# Altium integrated library Weidmueller_OMNIMATE_Signal.IntLib: 2550 symbols (part 9 of 45)
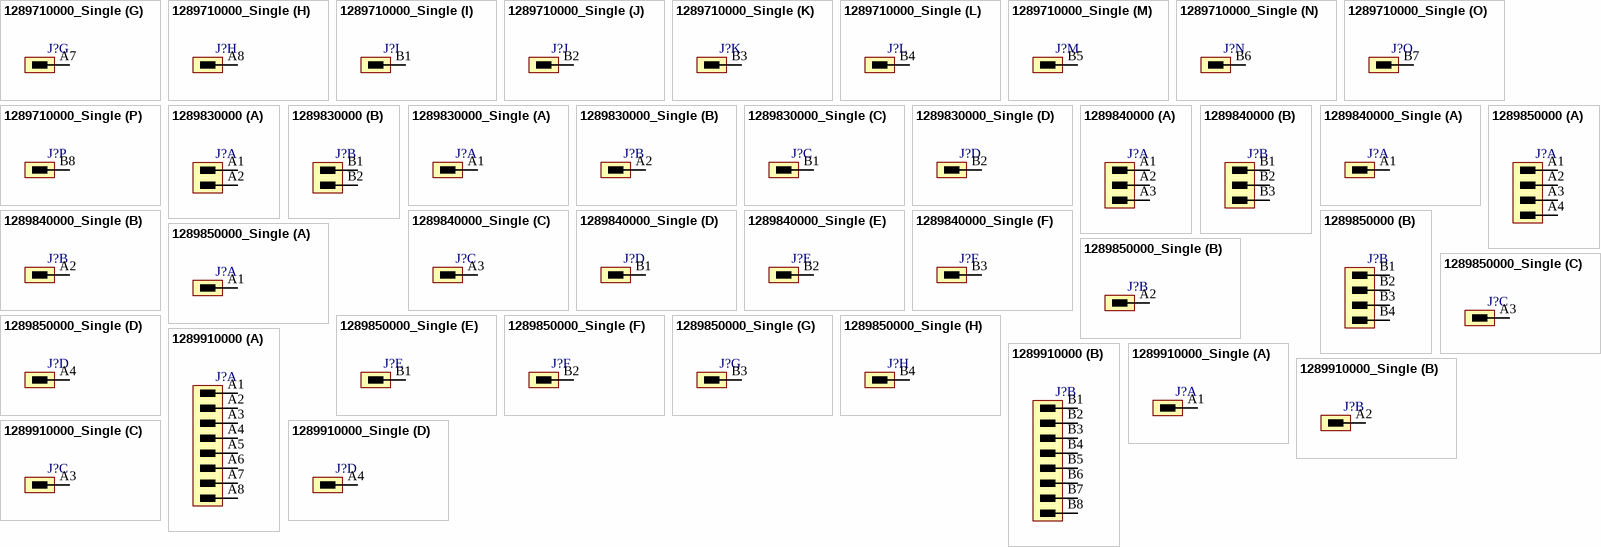
[diagram p219: symbols 1289710000_Single to 1289910000_Single]

## 1289830000_Single
designator J?
OMNIMATE Signal - series B2C/S2C 3.50 - 2-row; PartNumber: 1289830000; Manufacturer: Weidmueller; Short_text_for_material: S2C-SMT 3.50/04/90LF 1.5SN BK BX; Side_termination_characteristic: Solder flange; Mounting_onto_the_PCB: Reflow solder connection; Pitch_mm: 3.5 mm; Pitch_inch: 0.138 inch; No_of_poles: 4; Outgoing_elbow: 90°; Solder_pin_length_mm: 1.5 mm; Contact_material: Cu-Leg; Contact_surface: tinned; Insulating_material: LCP GF; UL_94_flammability_rating: V-0; Rated_voltage_for_surge_voltage_class_pollution_degree_II_2: 200 V; Rated_voltage_use_group_B_UL_1059: 150 V; Rated_current_use_group_B_UL_1059: 10 A; PackageReference: S2C_SMT_3_50_90LF_04; Colour: Black; Packaging: Box; Qty: 132 PCS; Revision: V1; ComponentLink1Description: Manufacturer URL; ComponentLink1URL: http://www.weidmueller.com/; ComponentLink2Description: URL Link1; ComponentLink2URL: http://catalog.weidmueller.com/catalog/Start.do?localeId=en&ObjectID=1289830000
footprint S2C_SMT_3_50_90LF_04 (OMNIMATE Signal - Serie B2C/S2C 3.50 - 2-reihig  S2C-SMT 3.50/04/90LF 1.5)
part A pins: A1
part B pins: A2
part C pins: B1
part D pins: B2

## 1289840000
designator J?
OMNIMATE Signal - series B2C/S2C 3.50 - 2-row; PartNumber: 1289840000; Manufacturer: Weidmueller; Short_text_for_material: S2C-SMT 3.50/06/90LF 1.5SN BK BX; Side_termination_characteristic: Solder flange; Mounting_onto_the_PCB: Reflow solder connection; Pitch_mm: 3.5 mm; Pitch_inch: 0.138 inch; No_of_poles: 6; Outgoing_elbow: 90°; Solder_pin_length_mm: 1.5 mm; Contact_material: Cu-Leg; Contact_surface: tinned; Insulating_material: LCP GF; UL_94_flammability_rating: V-0; Rated_voltage_for_surge_voltage_class_pollution_degree_II_2: 200 V; Rated_voltage_use_group_B_UL_1059: 150 V; Rated_current_use_group_B_UL_1059: 10 A; PackageReference: S2C_SMT_3_50_90LF_06; Colour: Black; Packaging: Box; Qty: 102 PCS; Revision: V1; ComponentLink1Description: Manufacturer URL; ComponentLink1URL: http://www.weidmueller.com/; ComponentLink2Description: URL Link1; ComponentLink2URL: http://catalog.weidmueller.com/catalog/Start.do?localeId=en&ObjectID=1289840000
footprint S2C_SMT_3_50_90LF_06 (OMNIMATE Signal - Serie B2C/S2C 3.50 - 2-reihig  S2C-SMT 3.50/06/90LF 1.5)
part A pins: A1, A2, A3
part B pins: B1, B2, B3

## 1289840000_Single
designator J?
OMNIMATE Signal - series B2C/S2C 3.50 - 2-row; PartNumber: 1289840000; Manufacturer: Weidmueller; Short_text_for_material: S2C-SMT 3.50/06/90LF 1.5SN BK BX; Side_termination_characteristic: Solder flange; Mounting_onto_the_PCB: Reflow solder connection; Pitch_mm: 3.5 mm; Pitch_inch: 0.138 inch; No_of_poles: 6; Outgoing_elbow: 90°; Solder_pin_length_mm: 1.5 mm; Contact_material: Cu-Leg; Contact_surface: tinned; Insulating_material: LCP GF; UL_94_flammability_rating: V-0; Rated_voltage_for_surge_voltage_class_pollution_degree_II_2: 200 V; Rated_voltage_use_group_B_UL_1059: 150 V; Rated_current_use_group_B_UL_1059: 10 A; PackageReference: S2C_SMT_3_50_90LF_06; Colour: Black; Packaging: Box; Qty: 102 PCS; Revision: V1; ComponentLink1Description: Manufacturer URL; ComponentLink1URL: http://www.weidmueller.com/; ComponentLink2Description: URL Link1; ComponentLink2URL: http://catalog.weidmueller.com/catalog/Start.do?localeId=en&ObjectID=1289840000
footprint S2C_SMT_3_50_90LF_06 (OMNIMATE Signal - Serie B2C/S2C 3.50 - 2-reihig  S2C-SMT 3.50/06/90LF 1.5)
part A pins: A1
part B pins: A2
part C pins: A3
part D pins: B1
part E pins: B2
part F pins: B3

## 1289850000
designator J?
OMNIMATE Signal - series B2C/S2C 3.50 - 2-row; PartNumber: 1289850000; Manufacturer: Weidmueller; Short_text_for_material: S2C-SMT 3.50/08/90LF 1.5SN BK BX; Side_termination_characteristic: Solder flange; Mounting_onto_the_PCB: Reflow solder connection; Pitch_mm: 3.5 mm; Pitch_inch: 0.138 inch; No_of_poles: 8; Outgoing_elbow: 90°; Solder_pin_length_mm: 1.5 mm; Contact_material: Cu-Leg; Contact_surface: tinned; Insulating_material: LCP GF; UL_94_flammability_rating: V-0; Rated_voltage_for_surge_voltage_class_pollution_degree_II_2: 200 V; Rated_voltage_use_group_B_UL_1059: 150 V; Rated_current_use_group_B_UL_1059: 10 A; PackageReference: S2C_SMT_3_50_90LF_08; Colour: Black; Packaging: Box; Qty: 84 PCS; Revision: V1; ComponentLink1Description: Manufacturer URL; ComponentLink1URL: http://www.weidmueller.com/; ComponentLink2Description: URL Link1; ComponentLink2URL: http://catalog.weidmueller.com/catalog/Start.do?localeId=en&ObjectID=1289850000
footprint S2C_SMT_3_50_90LF_08 (OMNIMATE Signal - Serie B2C/S2C 3.50 - 2-reihig  S2C-SMT 3.50/08/90LF 1.5)
part A pins: A1, A2, A3, A4
part B pins: B1, B2, B3, B4

## 1289850000_Single
designator J?
OMNIMATE Signal - series B2C/S2C 3.50 - 2-row; PartNumber: 1289850000; Manufacturer: Weidmueller; Short_text_for_material: S2C-SMT 3.50/08/90LF 1.5SN BK BX; Side_termination_characteristic: Solder flange; Mounting_onto_the_PCB: Reflow solder connection; Pitch_mm: 3.5 mm; Pitch_inch: 0.138 inch; No_of_poles: 8; Outgoing_elbow: 90°; Solder_pin_length_mm: 1.5 mm; Contact_material: Cu-Leg; Contact_surface: tinned; Insulating_material: LCP GF; UL_94_flammability_rating: V-0; Rated_voltage_for_surge_voltage_class_pollution_degree_II_2: 200 V; Rated_voltage_use_group_B_UL_1059: 150 V; Rated_current_use_group_B_UL_1059: 10 A; PackageReference: S2C_SMT_3_50_90LF_08; Colour: Black; Packaging: Box; Qty: 84 PCS; Revision: V1; ComponentLink1Description: Manufacturer URL; ComponentLink1URL: http://www.weidmueller.com/; ComponentLink2Description: URL Link1; ComponentLink2URL: http://catalog.weidmueller.com/catalog/Start.do?localeId=en&ObjectID=1289850000
footprint S2C_SMT_3_50_90LF_08 (OMNIMATE Signal - Serie B2C/S2C 3.50 - 2-reihig  S2C-SMT 3.50/08/90LF 1.5)
part A pins: A1
part B pins: A2
part C pins: A3
part D pins: A4
part E pins: B1
part F pins: B2
part G pins: B3
part H pins: B4

## 1289910000
designator J?
OMNIMATE Signal - series B2C/S2C 3.50 - 2-row; PartNumber: 1289910000; Manufacturer: Weidmueller; Short_text_for_material: S2C-SMT 3.50/16/90LF 1.5SN BK BX; Side_termination_characteristic: Solder flange; Mounting_onto_the_PCB: Reflow solder connection; Pitch_mm: 3.5 mm; Pitch_inch: 0.138 inch; No_of_poles: 16; Outgoing_elbow: 90°; Solder_pin_length_mm: 1.5 mm; Contact_material: Cu-Leg; Contact_surface: tinned; Insulating_material: LCP GF; UL_94_flammability_rating: V-0; Rated_voltage_for_surge_voltage_class_pollution_degree_II_2: 200 V; Rated_voltage_use_group_B_UL_1059: 150 V; Rated_current_use_group_B_UL_1059: 10 A; PackageReference: S2C_SMT_3_50_90LF_16; Colour: Black; Packaging: Box; Qty: 48 PCS; Revision: V1; ComponentLink1Description: Manufacturer URL; ComponentLink1URL: http://www.weidmueller.com/; ComponentLink2Description: URL Link1; ComponentLink2URL: http://catalog.weidmueller.com/catalog/Start.do?localeId=en&ObjectID=1289910000
footprint S2C_SMT_3_50_90LF_16 (OMNIMATE Signal - Serie B2C/S2C 3.50 - 2-reihig  S2C-SMT 3.50/16/90LF 1.5)
part A pins: A1, A2, A3, A4, A5, A6, A7, A8
part B pins: B1, B2, B3, B4, B5, B6, B7, B8

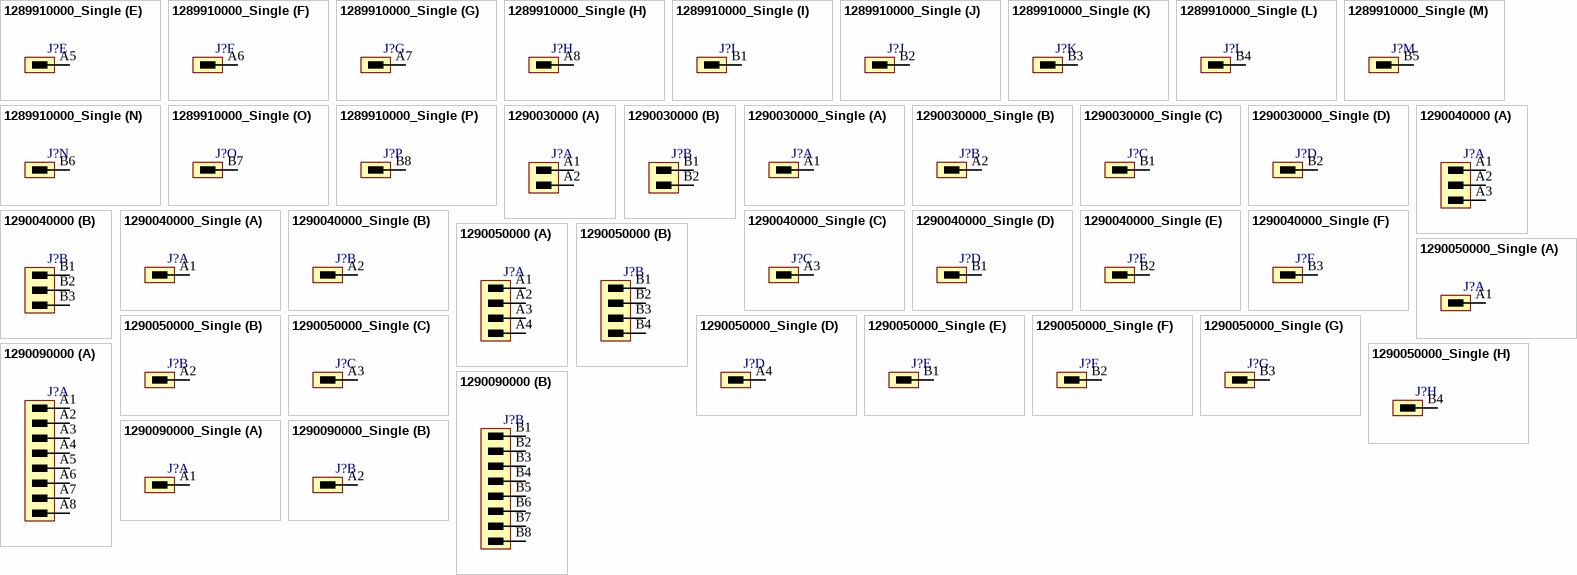
[diagram p50: symbols 1289910000_Single to 1290090000_Single]

## 1289910000_Single
designator J?
OMNIMATE Signal - series B2C/S2C 3.50 - 2-row; PartNumber: 1289910000; Manufacturer: Weidmueller; Short_text_for_material: S2C-SMT 3.50/16/90LF 1.5SN BK BX; Side_termination_characteristic: Solder flange; Mounting_onto_the_PCB: Reflow solder connection; Pitch_mm: 3.5 mm; Pitch_inch: 0.138 inch; No_of_poles: 16; Outgoing_elbow: 90°; Solder_pin_length_mm: 1.5 mm; Contact_material: Cu-Leg; Contact_surface: tinned; Insulating_material: LCP GF; UL_94_flammability_rating: V-0; Rated_voltage_for_surge_voltage_class_pollution_degree_II_2: 200 V; Rated_voltage_use_group_B_UL_1059: 150 V; Rated_current_use_group_B_UL_1059: 10 A; PackageReference: S2C_SMT_3_50_90LF_16; Colour: Black; Packaging: Box; Qty: 48 PCS; Revision: V1; ComponentLink1Description: Manufacturer URL; ComponentLink1URL: http://www.weidmueller.com/; ComponentLink2Description: URL Link1; ComponentLink2URL: http://catalog.weidmueller.com/catalog/Start.do?localeId=en&ObjectID=1289910000
footprint S2C_SMT_3_50_90LF_16 (OMNIMATE Signal - Serie B2C/S2C 3.50 - 2-reihig  S2C-SMT 3.50/16/90LF 1.5)
part A pins: A1
part B pins: A2
part C pins: A3
part D pins: A4
part E pins: A5
part F pins: A6
part G pins: A7
part H pins: A8
part I pins: B1
part J pins: B2
part K pins: B3
part L pins: B4
part M pins: B5
part N pins: B6
part O pins: B7
part P pins: B8

## 1290030000
designator J?
OMNIMATE Signal - series B2C/S2C 3.50 - 2-row; PartNumber: 1290030000; Manufacturer: Weidmueller; Short_text_for_material: S2C-SMT 3.50/04/180G 3.5SN BK BX; Side_termination_characteristic: closed side; Mounting_onto_the_PCB: Reflow solder connection; Pitch_mm: 3.5 mm; Pitch_inch: 0.138 inch; No_of_poles: 4; Outgoing_elbow: 180°; Contact_surface: tinned; Insulating_material: LCP GF; UL_94_flammability_rating: V-0; Rated_voltage_for_surge_voltage_class_pollution_degree_II_2: 200 V; Rated_current_min_no_of_poles_TU_20_deg_C: 13.4 A; Rated_voltage_use_group_B_UL_1059: 150 V; Rated_current_use_group_B_UL_1059: 10 A; PackageReference: S2C_SMT_3_50_180G_04; Colour: Black; Solder_pin_length_mm: 3.5 mm; Packaging: Box; Qty: 222 PCS; Revision: V1; ComponentLink1Description: Manufacturer URL; ComponentLink1URL: http://www.weidmueller.com/; ComponentLink2Description: URL Link1; ComponentLink2URL: http://catalog.weidmueller.com/catalog/Start.do?localeId=en&ObjectID=1290030000
footprint S2C_SMT_3_50_180G_04 (OMNIMATE Signal - Serie B2C/S2C 3.50 - 2-reihig  S2C-SMT 3.50/04/180G 1.5)
part A pins: A1, A2
part B pins: B1, B2

## 1290030000_Single
designator J?
OMNIMATE Signal - series B2C/S2C 3.50 - 2-row; PartNumber: 1290030000; Manufacturer: Weidmueller; Short_text_for_material: S2C-SMT 3.50/04/180G 3.5SN BK BX; Side_termination_characteristic: closed side; Mounting_onto_the_PCB: Reflow solder connection; Pitch_mm: 3.5 mm; Pitch_inch: 0.138 inch; No_of_poles: 4; Outgoing_elbow: 180°; Contact_surface: tinned; Insulating_material: LCP GF; UL_94_flammability_rating: V-0; Rated_voltage_for_surge_voltage_class_pollution_degree_II_2: 200 V; Rated_current_min_no_of_poles_TU_20_deg_C: 13.4 A; Rated_voltage_use_group_B_UL_1059: 150 V; Rated_current_use_group_B_UL_1059: 10 A; PackageReference: S2C_SMT_3_50_180G_04; Colour: Black; Solder_pin_length_mm: 3.5 mm; Packaging: Box; Qty: 222 PCS; Revision: V1; ComponentLink1Description: Manufacturer URL; ComponentLink1URL: http://www.weidmueller.com/; ComponentLink2Description: URL Link1; ComponentLink2URL: http://catalog.weidmueller.com/catalog/Start.do?localeId=en&ObjectID=1290030000
footprint S2C_SMT_3_50_180G_04 (OMNIMATE Signal - Serie B2C/S2C 3.50 - 2-reihig  S2C-SMT 3.50/04/180G 1.5)
part A pins: A1
part B pins: A2
part C pins: B1
part D pins: B2

## 1290040000
designator J?
OMNIMATE Signal - series B2C/S2C 3.50 - 2-row; PartNumber: 1290040000; Manufacturer: Weidmueller; Short_text_for_material: S2C-SMT 3.50/06/180G 3.5SN BK BX; Side_termination_characteristic: closed side; Mounting_onto_the_PCB: Reflow solder connection; Pitch_mm: 3.5 mm; Pitch_inch: 0.138 inch; No_of_poles: 6; Outgoing_elbow: 180°; Contact_surface: tinned; Insulating_material: LCP GF; UL_94_flammability_rating: V-0; Rated_voltage_for_surge_voltage_class_pollution_degree_II_2: 200 V; Rated_current_min_no_of_poles_TU_20_deg_C: 13.4 A; Rated_voltage_use_group_B_UL_1059: 150 V; Rated_current_use_group_B_UL_1059: 10 A; PackageReference: S2C_SMT_3_50_180G_06; Colour: Black; Solder_pin_length_mm: 3.5 mm; Packaging: Box; Qty: 156 PCS; Revision: V1; ComponentLink1Description: Manufacturer URL; ComponentLink1URL: http://www.weidmueller.com/; ComponentLink2Description: URL Link1; ComponentLink2URL: http://catalog.weidmueller.com/catalog/Start.do?localeId=en&ObjectID=1290040000
footprint S2C_SMT_3_50_180G_06 (OMNIMATE Signal - Serie B2C/S2C 3.50 - 2-reihig  S2C-SMT 3.50/06/180G 1.5)
part A pins: A1, A2, A3
part B pins: B1, B2, B3

## 1290040000_Single
designator J?
OMNIMATE Signal - series B2C/S2C 3.50 - 2-row; PartNumber: 1290040000; Manufacturer: Weidmueller; Short_text_for_material: S2C-SMT 3.50/06/180G 3.5SN BK BX; Side_termination_characteristic: closed side; Mounting_onto_the_PCB: Reflow solder connection; Pitch_mm: 3.5 mm; Pitch_inch: 0.138 inch; No_of_poles: 6; Outgoing_elbow: 180°; Contact_surface: tinned; Insulating_material: LCP GF; UL_94_flammability_rating: V-0; Rated_voltage_for_surge_voltage_class_pollution_degree_II_2: 200 V; Rated_current_min_no_of_poles_TU_20_deg_C: 13.4 A; Rated_voltage_use_group_B_UL_1059: 150 V; Rated_current_use_group_B_UL_1059: 10 A; PackageReference: S2C_SMT_3_50_180G_06; Colour: Black; Solder_pin_length_mm: 3.5 mm; Packaging: Box; Qty: 156 PCS; Revision: V1; ComponentLink1Description: Manufacturer URL; ComponentLink1URL: http://www.weidmueller.com/; ComponentLink2Description: URL Link1; ComponentLink2URL: http://catalog.weidmueller.com/catalog/Start.do?localeId=en&ObjectID=1290040000
footprint S2C_SMT_3_50_180G_06 (OMNIMATE Signal - Serie B2C/S2C 3.50 - 2-reihig  S2C-SMT 3.50/06/180G 1.5)
part A pins: A1
part B pins: A2
part C pins: A3
part D pins: B1
part E pins: B2
part F pins: B3

## 1290050000
designator J?
OMNIMATE Signal - series B2C/S2C 3.50 - 2-row; PartNumber: 1290050000; Manufacturer: Weidmueller; Short_text_for_material: S2C-SMT 3.50/08/180G 3.5SN BK BX; Side_termination_characteristic: closed side; Mounting_onto_the_PCB: Reflow solder connection; Pitch_mm: 3.5 mm; Pitch_inch: 0.138 inch; No_of_poles: 8; Outgoing_elbow: 180°; Contact_surface: tinned; Insulating_material: LCP GF; UL_94_flammability_rating: V-0; Rated_voltage_for_surge_voltage_class_pollution_degree_II_2: 200 V; Rated_current_min_no_of_poles_TU_20_deg_C: 13.4 A; Rated_voltage_use_group_B_UL_1059: 150 V; Rated_current_use_group_B_UL_1059: 10 A; PackageReference: S2C_SMT_3_50_180G_08; Colour: Black; Solder_pin_length_mm: 3.5 mm; Packaging: Box; Qty: 120 PCS; Revision: V1; ComponentLink1Description: Manufacturer URL; ComponentLink1URL: http://www.weidmueller.com/; ComponentLink2Description: URL Link1; ComponentLink2URL: http://catalog.weidmueller.com/catalog/Start.do?localeId=en&ObjectID=1290050000
footprint S2C_SMT_3_50_180G_08 (OMNIMATE Signal - Serie B2C/S2C 3.50 - 2-reihig  S2C-SMT 3.50/08/180G 1.5)
part A pins: A1, A2, A3, A4
part B pins: B1, B2, B3, B4

## 1290050000_Single
designator J?
OMNIMATE Signal - series B2C/S2C 3.50 - 2-row; PartNumber: 1290050000; Manufacturer: Weidmueller; Short_text_for_material: S2C-SMT 3.50/08/180G 3.5SN BK BX; Side_termination_characteristic: closed side; Mounting_onto_the_PCB: Reflow solder connection; Pitch_mm: 3.5 mm; Pitch_inch: 0.138 inch; No_of_poles: 8; Outgoing_elbow: 180°; Contact_surface: tinned; Insulating_material: LCP GF; UL_94_flammability_rating: V-0; Rated_voltage_for_surge_voltage_class_pollution_degree_II_2: 200 V; Rated_current_min_no_of_poles_TU_20_deg_C: 13.4 A; Rated_voltage_use_group_B_UL_1059: 150 V; Rated_current_use_group_B_UL_1059: 10 A; PackageReference: S2C_SMT_3_50_180G_08; Colour: Black; Solder_pin_length_mm: 3.5 mm; Packaging: Box; Qty: 120 PCS; Revision: V1; ComponentLink1Description: Manufacturer URL; ComponentLink1URL: http://www.weidmueller.com/; ComponentLink2Description: URL Link1; ComponentLink2URL: http://catalog.weidmueller.com/catalog/Start.do?localeId=en&ObjectID=1290050000
footprint S2C_SMT_3_50_180G_08 (OMNIMATE Signal - Serie B2C/S2C 3.50 - 2-reihig  S2C-SMT 3.50/08/180G 1.5)
part A pins: A1
part B pins: A2
part C pins: A3
part D pins: A4
part E pins: B1
part F pins: B2
part G pins: B3
part H pins: B4

## 1290090000
designator J?
OMNIMATE Signal - series B2C/S2C 3.50 - 2-row; PartNumber: 1290090000; Manufacturer: Weidmueller; Short_text_for_material: S2C-SMT 3.50/16/180G 3.5SN BK BX; Side_termination_characteristic: closed side; Mounting_onto_the_PCB: Reflow solder connection; Pitch_mm: 3.5 mm; Pitch_inch: 0.138 inch; No_of_poles: 16; Outgoing_elbow: 180°; Contact_surface: tinned; Insulating_material: LCP GF; UL_94_flammability_rating: V-0; Rated_voltage_for_surge_voltage_class_pollution_degree_II_2: 200 V; Rated_current_min_no_of_poles_TU_20_deg_C: 13.4 A; Rated_voltage_use_group_B_UL_1059: 150 V; Rated_current_use_group_B_UL_1059: 10 A; PackageReference: S2C_SMT_3_50_180G_16; Colour: Black; Solder_pin_length_mm: 3.5 mm; Packaging: Box; Qty: 60 PCS; Revision: V1; ComponentLink1Description: Manufacturer URL; ComponentLink1URL: http://www.weidmueller.com/; ComponentLink2Description: URL Link1; ComponentLink2URL: http://catalog.weidmueller.com/catalog/Start.do?localeId=en&ObjectID=1290090000
footprint S2C_SMT_3_50_180G_16 (OMNIMATE Signal - Serie B2C/S2C 3.50 - 2-reihig  S2C-SMT 3.50/16/180G 1.5)
part A pins: A1, A2, A3, A4, A5, A6, A7, A8
part B pins: B1, B2, B3, B4, B5, B6, B7, B8

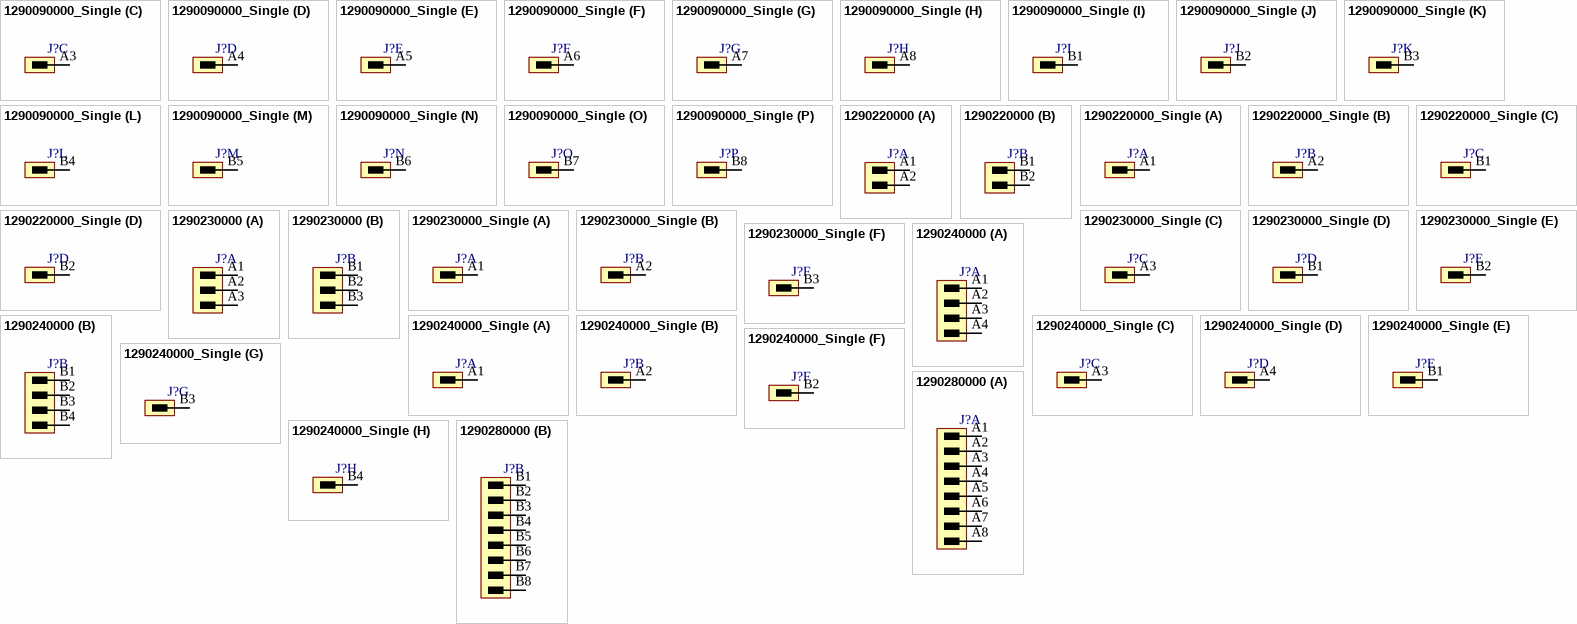
[diagram p51: symbols 1290090000_Single to 1290280000]

## 1290090000_Single
designator J?
OMNIMATE Signal - series B2C/S2C 3.50 - 2-row; PartNumber: 1290090000; Manufacturer: Weidmueller; Short_text_for_material: S2C-SMT 3.50/16/180G 3.5SN BK BX; Side_termination_characteristic: closed side; Mounting_onto_the_PCB: Reflow solder connection; Pitch_mm: 3.5 mm; Pitch_inch: 0.138 inch; No_of_poles: 16; Outgoing_elbow: 180°; Contact_surface: tinned; Insulating_material: LCP GF; UL_94_flammability_rating: V-0; Rated_voltage_for_surge_voltage_class_pollution_degree_II_2: 200 V; Rated_current_min_no_of_poles_TU_20_deg_C: 13.4 A; Rated_voltage_use_group_B_UL_1059: 150 V; Rated_current_use_group_B_UL_1059: 10 A; PackageReference: S2C_SMT_3_50_180G_16; Colour: Black; Solder_pin_length_mm: 3.5 mm; Packaging: Box; Qty: 60 PCS; Revision: V1; ComponentLink1Description: Manufacturer URL; ComponentLink1URL: http://www.weidmueller.com/; ComponentLink2Description: URL Link1; ComponentLink2URL: http://catalog.weidmueller.com/catalog/Start.do?localeId=en&ObjectID=1290090000
footprint S2C_SMT_3_50_180G_16 (OMNIMATE Signal - Serie B2C/S2C 3.50 - 2-reihig  S2C-SMT 3.50/16/180G 1.5)
part A pins: A1
part B pins: A2
part C pins: A3
part D pins: A4
part E pins: A5
part F pins: A6
part G pins: A7
part H pins: A8
part I pins: B1
part J pins: B2
part K pins: B3
part L pins: B4
part M pins: B5
part N pins: B6
part O pins: B7
part P pins: B8

## 1290220000
designator J?
OMNIMATE Signal - series B2C/S2C 3.50 - 2-row; PartNumber: 1290220000; Manufacturer: Weidmueller; Short_text_for_material: S2C-SMT 3.50/04/180LF 3.5SN BK BX; Side_termination_characteristic: Solder flange; Mounting_onto_the_PCB: Reflow solder connection; Pitch_mm: 3.5 mm; Pitch_inch: 0.138 inch; No_of_poles: 4; Outgoing_elbow: 180°; Contact_material: Cu-Leg; Contact_surface: tinned; Insulating_material: LCP GF; UL_94_flammability_rating: V-0; Rated_voltage_for_surge_voltage_class_pollution_degree_II_2: 200 V; Rated_voltage_use_group_B_UL_1059: 150 V; Rated_current_use_group_B_UL_1059: 10 A; PackageReference: S2C_SMT_3_50_180LF_04; Colour: Black; Solder_pin_length_mm: 3.5 mm; Packaging: Box; Qty: 132 PCS; Revision: V1; ComponentLink1Description: Manufacturer URL; ComponentLink1URL: http://www.weidmueller.com/; ComponentLink2Description: URL Link1; ComponentLink2URL: http://catalog.weidmueller.com/catalog/Start.do?localeId=en&ObjectID=1290220000
footprint S2C_SMT_3_50_180LF_04 (OMNIMATE Signal - Serie B2C/S2C 3.50 - 2-reihig  S2C-SMT 3.50/04/180LF 3.5)
part A pins: A1, A2
part B pins: B1, B2

## 1290220000_Single
designator J?
OMNIMATE Signal - series B2C/S2C 3.50 - 2-row; PartNumber: 1290220000; Manufacturer: Weidmueller; Short_text_for_material: S2C-SMT 3.50/04/180LF 3.5SN BK BX; Side_termination_characteristic: Solder flange; Mounting_onto_the_PCB: Reflow solder connection; Pitch_mm: 3.5 mm; Pitch_inch: 0.138 inch; No_of_poles: 4; Outgoing_elbow: 180°; Contact_material: Cu-Leg; Contact_surface: tinned; Insulating_material: LCP GF; UL_94_flammability_rating: V-0; Rated_voltage_for_surge_voltage_class_pollution_degree_II_2: 200 V; Rated_voltage_use_group_B_UL_1059: 150 V; Rated_current_use_group_B_UL_1059: 10 A; PackageReference: S2C_SMT_3_50_180LF_04; Colour: Black; Solder_pin_length_mm: 3.5 mm; Packaging: Box; Qty: 132 PCS; Revision: V1; ComponentLink1Description: Manufacturer URL; ComponentLink1URL: http://www.weidmueller.com/; ComponentLink2Description: URL Link1; ComponentLink2URL: http://catalog.weidmueller.com/catalog/Start.do?localeId=en&ObjectID=1290220000
footprint S2C_SMT_3_50_180LF_04 (OMNIMATE Signal - Serie B2C/S2C 3.50 - 2-reihig  S2C-SMT 3.50/04/180LF 3.5)
part A pins: A1
part B pins: A2
part C pins: B1
part D pins: B2

## 1290230000
designator J?
OMNIMATE Signal - series B2C/S2C 3.50 - 2-row; PartNumber: 1290230000; Manufacturer: Weidmueller; Short_text_for_material: S2C-SMT 3.50/06/180LF 3.5SN BK BX; Side_termination_characteristic: Solder flange; Mounting_onto_the_PCB: Reflow solder connection; Pitch_mm: 3.5 mm; Pitch_inch: 0.138 inch; No_of_poles: 6; Outgoing_elbow: 180°; Contact_material: Cu-Leg; Contact_surface: tinned; Insulating_material: LCP GF; UL_94_flammability_rating: V-0; Rated_voltage_for_surge_voltage_class_pollution_degree_II_2: 200 V; Rated_voltage_use_group_B_UL_1059: 150 V; Rated_current_use_group_B_UL_1059: 10 A; PackageReference: S2C_SMT_3_50_180LF_06; Colour: Black; Solder_pin_length_mm: 3.5 mm; Packaging: Box; Qty: 102 PCS; Revision: V1; ComponentLink1Description: Manufacturer URL; ComponentLink1URL: http://www.weidmueller.com/; ComponentLink2Description: URL Link1; ComponentLink2URL: http://catalog.weidmueller.com/catalog/Start.do?localeId=en&ObjectID=1290230000
footprint S2C_SMT_3_50_180LF_06 (OMNIMATE Signal - Serie B2C/S2C 3.50 - 2-reihig  S2C-SMT 3.50/06/180LF 3.5)
part A pins: A1, A2, A3
part B pins: B1, B2, B3

## 1290230000_Single
designator J?
OMNIMATE Signal - series B2C/S2C 3.50 - 2-row; PartNumber: 1290230000; Manufacturer: Weidmueller; Short_text_for_material: S2C-SMT 3.50/06/180LF 3.5SN BK BX; Side_termination_characteristic: Solder flange; Mounting_onto_the_PCB: Reflow solder connection; Pitch_mm: 3.5 mm; Pitch_inch: 0.138 inch; No_of_poles: 6; Outgoing_elbow: 180°; Contact_material: Cu-Leg; Contact_surface: tinned; Insulating_material: LCP GF; UL_94_flammability_rating: V-0; Rated_voltage_for_surge_voltage_class_pollution_degree_II_2: 200 V; Rated_voltage_use_group_B_UL_1059: 150 V; Rated_current_use_group_B_UL_1059: 10 A; PackageReference: S2C_SMT_3_50_180LF_06; Colour: Black; Solder_pin_length_mm: 3.5 mm; Packaging: Box; Qty: 102 PCS; Revision: V1; ComponentLink1Description: Manufacturer URL; ComponentLink1URL: http://www.weidmueller.com/; ComponentLink2Description: URL Link1; ComponentLink2URL: http://catalog.weidmueller.com/catalog/Start.do?localeId=en&ObjectID=1290230000
footprint S2C_SMT_3_50_180LF_06 (OMNIMATE Signal - Serie B2C/S2C 3.50 - 2-reihig  S2C-SMT 3.50/06/180LF 3.5)
part A pins: A1
part B pins: A2
part C pins: A3
part D pins: B1
part E pins: B2
part F pins: B3

## 1290240000
designator J?
OMNIMATE Signal - series B2C/S2C 3.50 - 2-row; PartNumber: 1290240000; Manufacturer: Weidmueller; Short_text_for_material: S2C-SMT 3.50/08/180LF 3.5SN BK BX; Side_termination_characteristic: Solder flange; Mounting_onto_the_PCB: Reflow solder connection; Pitch_mm: 3.5 mm; Pitch_inch: 0.138 inch; No_of_poles: 8; Outgoing_elbow: 180°; Contact_material: Cu-Leg; Contact_surface: tinned; Insulating_material: LCP GF; UL_94_flammability_rating: V-0; Rated_voltage_for_surge_voltage_class_pollution_degree_II_2: 200 V; Rated_voltage_use_group_B_UL_1059: 150 V; Rated_current_use_group_B_UL_1059: 10 A; PackageReference: S2C_SMT_3_50_180LF_08; Colour: Black; Solder_pin_length_mm: 3.5 mm; Packaging: Box; Qty: 84 PCS; Revision: V1; ComponentLink1Description: Manufacturer URL; ComponentLink1URL: http://www.weidmueller.com/; ComponentLink2Description: URL Link1; ComponentLink2URL: http://catalog.weidmueller.com/catalog/Start.do?localeId=en&ObjectID=1290240000
footprint S2C_SMT_3_50_180LF_08 (OMNIMATE Signal - Serie B2C/S2C 3.50 - 2-reihig  S2C-SMT 3.50/08/180LF 3.5)
part A pins: A1, A2, A3, A4
part B pins: B1, B2, B3, B4

## 1290240000_Single
designator J?
OMNIMATE Signal - series B2C/S2C 3.50 - 2-row; PartNumber: 1290240000; Manufacturer: Weidmueller; Short_text_for_material: S2C-SMT 3.50/08/180LF 3.5SN BK BX; Side_termination_characteristic: Solder flange; Mounting_onto_the_PCB: Reflow solder connection; Pitch_mm: 3.5 mm; Pitch_inch: 0.138 inch; No_of_poles: 8; Outgoing_elbow: 180°; Contact_material: Cu-Leg; Contact_surface: tinned; Insulating_material: LCP GF; UL_94_flammability_rating: V-0; Rated_voltage_for_surge_voltage_class_pollution_degree_II_2: 200 V; Rated_voltage_use_group_B_UL_1059: 150 V; Rated_current_use_group_B_UL_1059: 10 A; PackageReference: S2C_SMT_3_50_180LF_08; Colour: Black; Solder_pin_length_mm: 3.5 mm; Packaging: Box; Qty: 84 PCS; Revision: V1; ComponentLink1Description: Manufacturer URL; ComponentLink1URL: http://www.weidmueller.com/; ComponentLink2Description: URL Link1; ComponentLink2URL: http://catalog.weidmueller.com/catalog/Start.do?localeId=en&ObjectID=1290240000
footprint S2C_SMT_3_50_180LF_08 (OMNIMATE Signal - Serie B2C/S2C 3.50 - 2-reihig  S2C-SMT 3.50/08/180LF 3.5)
part A pins: A1
part B pins: A2
part C pins: A3
part D pins: A4
part E pins: B1
part F pins: B2
part G pins: B3
part H pins: B4

## 1290280000
designator J?
OMNIMATE Signal - series B2C/S2C 3.50 - 2-row; PartNumber: 1290280000; Manufacturer: Weidmueller; Short_text_for_material: S2C-SMT 3.50/16/180LF 3.5SN BK BX; Side_termination_characteristic: Solder flange; Mounting_onto_the_PCB: Reflow solder connection; Pitch_mm: 3.5 mm; Pitch_inch: 0.138 inch; No_of_poles: 16; Outgoing_elbow: 180°; Contact_material: Cu-Leg; Contact_surface: tinned; Insulating_material: LCP GF; UL_94_flammability_rating: V-0; Rated_voltage_for_surge_voltage_class_pollution_degree_II_2: 200 V; Rated_voltage_use_group_B_UL_1059: 150 V; Rated_current_use_group_B_UL_1059: 10 A; PackageReference: S2C_SMT_3_50_180LF_16; Colour: Black; Solder_pin_length_mm: 3.5 mm; Packaging: Box; Qty: 48 PCS; Revision: V1; ComponentLink1Description: Manufacturer URL; ComponentLink1URL: http://www.weidmueller.com/; ComponentLink2Description: URL Link1; ComponentLink2URL: http://catalog.weidmueller.com/catalog/Start.do?localeId=en&ObjectID=1290280000
footprint S2C_SMT_3_50_180LF_16 (OMNIMATE Signal - Serie B2C/S2C 3.50 - 2-reihig  S2C-SMT 3.50/16/180LF 3.5)
part A pins: A1, A2, A3, A4, A5, A6, A7, A8
part B pins: B1, B2, B3, B4, B5, B6, B7, B8

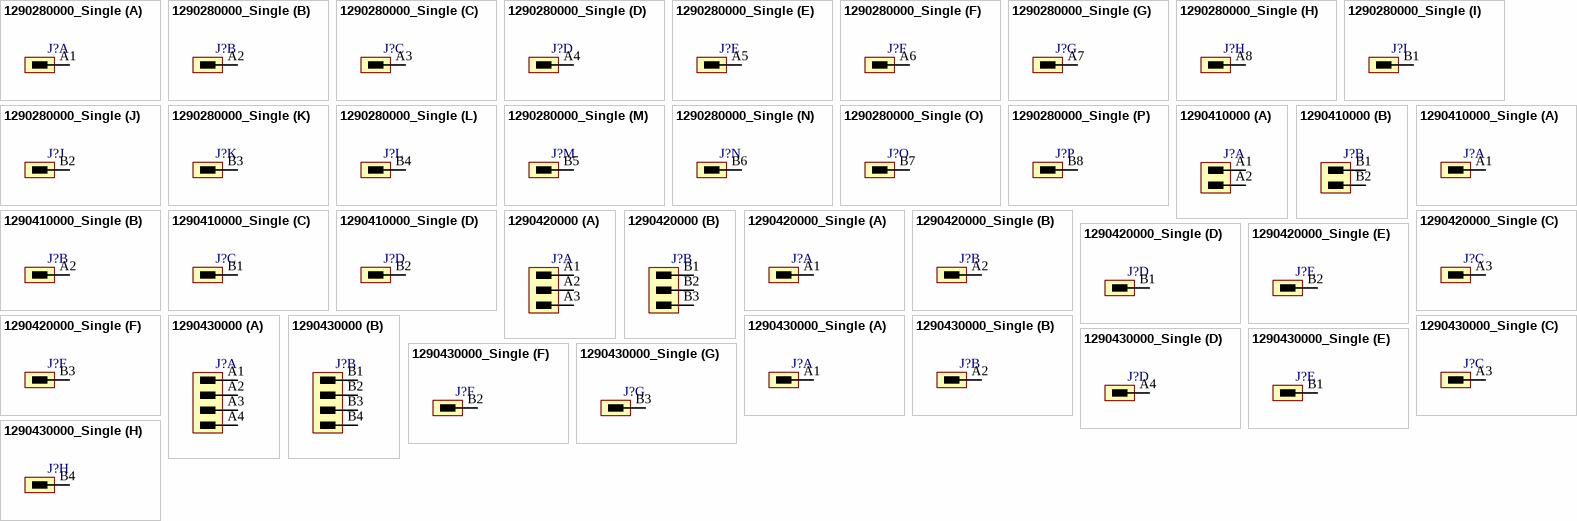
[diagram p52: symbols 1290280000_Single to 1290430000_Single]

## 1290280000_Single
designator J?
OMNIMATE Signal - series B2C/S2C 3.50 - 2-row; PartNumber: 1290280000; Manufacturer: Weidmueller; Short_text_for_material: S2C-SMT 3.50/16/180LF 3.5SN BK BX; Side_termination_characteristic: Solder flange; Mounting_onto_the_PCB: Reflow solder connection; Pitch_mm: 3.5 mm; Pitch_inch: 0.138 inch; No_of_poles: 16; Outgoing_elbow: 180°; Contact_material: Cu-Leg; Contact_surface: tinned; Insulating_material: LCP GF; UL_94_flammability_rating: V-0; Rated_voltage_for_surge_voltage_class_pollution_degree_II_2: 200 V; Rated_voltage_use_group_B_UL_1059: 150 V; Rated_current_use_group_B_UL_1059: 10 A; PackageReference: S2C_SMT_3_50_180LF_16; Colour: Black; Solder_pin_length_mm: 3.5 mm; Packaging: Box; Qty: 48 PCS; Revision: V1; ComponentLink1Description: Manufacturer URL; ComponentLink1URL: http://www.weidmueller.com/; ComponentLink2Description: URL Link1; ComponentLink2URL: http://catalog.weidmueller.com/catalog/Start.do?localeId=en&ObjectID=1290280000
footprint S2C_SMT_3_50_180LF_16 (OMNIMATE Signal - Serie B2C/S2C 3.50 - 2-reihig  S2C-SMT 3.50/16/180LF 3.5)
part A pins: A1
part B pins: A2
part C pins: A3
part D pins: A4
part E pins: A5
part F pins: A6
part G pins: A7
part H pins: A8
part I pins: B1
part J pins: B2
part K pins: B3
part L pins: B4
part M pins: B5
part N pins: B6
part O pins: B7
part P pins: B8

## 1290410000
designator J?
OMNIMATE Signal - series B2C/S2C 3.50 - 2-row; PartNumber: 1290410000; Manufacturer: Weidmueller; Short_text_for_material: S2C-SMT 3.50/04/180G 1.5SN BK BX; Side_termination_characteristic: closed side; Mounting_onto_the_PCB: Reflow solder connection; Pitch_mm: 3.5 mm; Pitch_inch: 0.138 inch; No_of_poles: 4; Outgoing_elbow: 180°; Solder_pin_length_mm: 1.5 mm; Contact_material: Cu-Leg; Contact_surface: tinned; Insulating_material: LCP GF; UL_94_flammability_rating: V-0; Rated_voltage_for_surge_voltage_class_pollution_degree_II_2: 200 V; Rated_voltage_use_group_B_UL_1059: 150 V; Rated_current_use_group_B_UL_1059: 10 A; PackageReference: S2C_SMT_3_50_180G_04; Colour: Black; Packaging: Box; Qty: 222 PCS; Revision: V1; ComponentLink1Description: Manufacturer URL; ComponentLink1URL: http://www.weidmueller.com/; ComponentLink2Description: URL Link1; ComponentLink2URL: http://catalog.weidmueller.com/catalog/Start.do?localeId=en&ObjectID=1290410000
footprint S2C_SMT_3_50_180G_04 (OMNIMATE Signal - Serie B2C/S2C 3.50 - 2-reihig  S2C-SMT 3.50/04/180G 1.5)
part A pins: A1, A2
part B pins: B1, B2

## 1290410000_Single
designator J?
OMNIMATE Signal - series B2C/S2C 3.50 - 2-row; PartNumber: 1290410000; Manufacturer: Weidmueller; Short_text_for_material: S2C-SMT 3.50/04/180G 1.5SN BK BX; Side_termination_characteristic: closed side; Mounting_onto_the_PCB: Reflow solder connection; Pitch_mm: 3.5 mm; Pitch_inch: 0.138 inch; No_of_poles: 4; Outgoing_elbow: 180°; Solder_pin_length_mm: 1.5 mm; Contact_material: Cu-Leg; Contact_surface: tinned; Insulating_material: LCP GF; UL_94_flammability_rating: V-0; Rated_voltage_for_surge_voltage_class_pollution_degree_II_2: 200 V; Rated_voltage_use_group_B_UL_1059: 150 V; Rated_current_use_group_B_UL_1059: 10 A; PackageReference: S2C_SMT_3_50_180G_04; Colour: Black; Packaging: Box; Qty: 222 PCS; Revision: V1; ComponentLink1Description: Manufacturer URL; ComponentLink1URL: http://www.weidmueller.com/; ComponentLink2Description: URL Link1; ComponentLink2URL: http://catalog.weidmueller.com/catalog/Start.do?localeId=en&ObjectID=1290410000
footprint S2C_SMT_3_50_180G_04 (OMNIMATE Signal - Serie B2C/S2C 3.50 - 2-reihig  S2C-SMT 3.50/04/180G 1.5)
part A pins: A1
part B pins: A2
part C pins: B1
part D pins: B2

## 1290420000
designator J?
OMNIMATE Signal - series B2C/S2C 3.50 - 2-row; PartNumber: 1290420000; Manufacturer: Weidmueller; Short_text_for_material: S2C-SMT 3.50/06/180G 1.5SN BK BX; Side_termination_characteristic: closed side; Mounting_onto_the_PCB: Reflow solder connection; Pitch_mm: 3.5 mm; Pitch_inch: 0.138 inch; No_of_poles: 6; Outgoing_elbow: 180°; Solder_pin_length_mm: 1.5 mm; Contact_material: Cu-Leg; Contact_surface: tinned; Insulating_material: LCP GF; UL_94_flammability_rating: V-0; Rated_voltage_for_surge_voltage_class_pollution_degree_II_2: 200 V; Rated_voltage_use_group_B_UL_1059: 150 V; Rated_current_use_group_B_UL_1059: 10 A; PackageReference: S2C_SMT_3_50_180G_06; Colour: Black; Packaging: Box; Qty: 156 PCS; Revision: V1; ComponentLink1Description: Manufacturer URL; ComponentLink1URL: http://www.weidmueller.com/; ComponentLink2Description: URL Link1; ComponentLink2URL: http://catalog.weidmueller.com/catalog/Start.do?localeId=en&ObjectID=1290420000
footprint S2C_SMT_3_50_180G_06 (OMNIMATE Signal - Serie B2C/S2C 3.50 - 2-reihig  S2C-SMT 3.50/06/180G 1.5)
part A pins: A1, A2, A3
part B pins: B1, B2, B3

## 1290420000_Single
designator J?
OMNIMATE Signal - series B2C/S2C 3.50 - 2-row; PartNumber: 1290420000; Manufacturer: Weidmueller; Short_text_for_material: S2C-SMT 3.50/06/180G 1.5SN BK BX; Side_termination_characteristic: closed side; Mounting_onto_the_PCB: Reflow solder connection; Pitch_mm: 3.5 mm; Pitch_inch: 0.138 inch; No_of_poles: 6; Outgoing_elbow: 180°; Solder_pin_length_mm: 1.5 mm; Contact_material: Cu-Leg; Contact_surface: tinned; Insulating_material: LCP GF; UL_94_flammability_rating: V-0; Rated_voltage_for_surge_voltage_class_pollution_degree_II_2: 200 V; Rated_voltage_use_group_B_UL_1059: 150 V; Rated_current_use_group_B_UL_1059: 10 A; PackageReference: S2C_SMT_3_50_180G_06; Colour: Black; Packaging: Box; Qty: 156 PCS; Revision: V1; ComponentLink1Description: Manufacturer URL; ComponentLink1URL: http://www.weidmueller.com/; ComponentLink2Description: URL Link1; ComponentLink2URL: http://catalog.weidmueller.com/catalog/Start.do?localeId=en&ObjectID=1290420000
footprint S2C_SMT_3_50_180G_06 (OMNIMATE Signal - Serie B2C/S2C 3.50 - 2-reihig  S2C-SMT 3.50/06/180G 1.5)
part A pins: A1
part B pins: A2
part C pins: A3
part D pins: B1
part E pins: B2
part F pins: B3

## 1290430000
designator J?